# Altium footprint library YQPOWER.PcbLib: 215 footprints (part 10 of 14)
Each footprint in its own frame and in the unit in brackets; x right, y up, seen from the top. Pads: shape width x height; smd on the part's side, far side on the other; paste and mask are expansions set on the pad; w line width, h text height; cw(c..) or ccw(c..) is an arc to the next point about the centre after c.
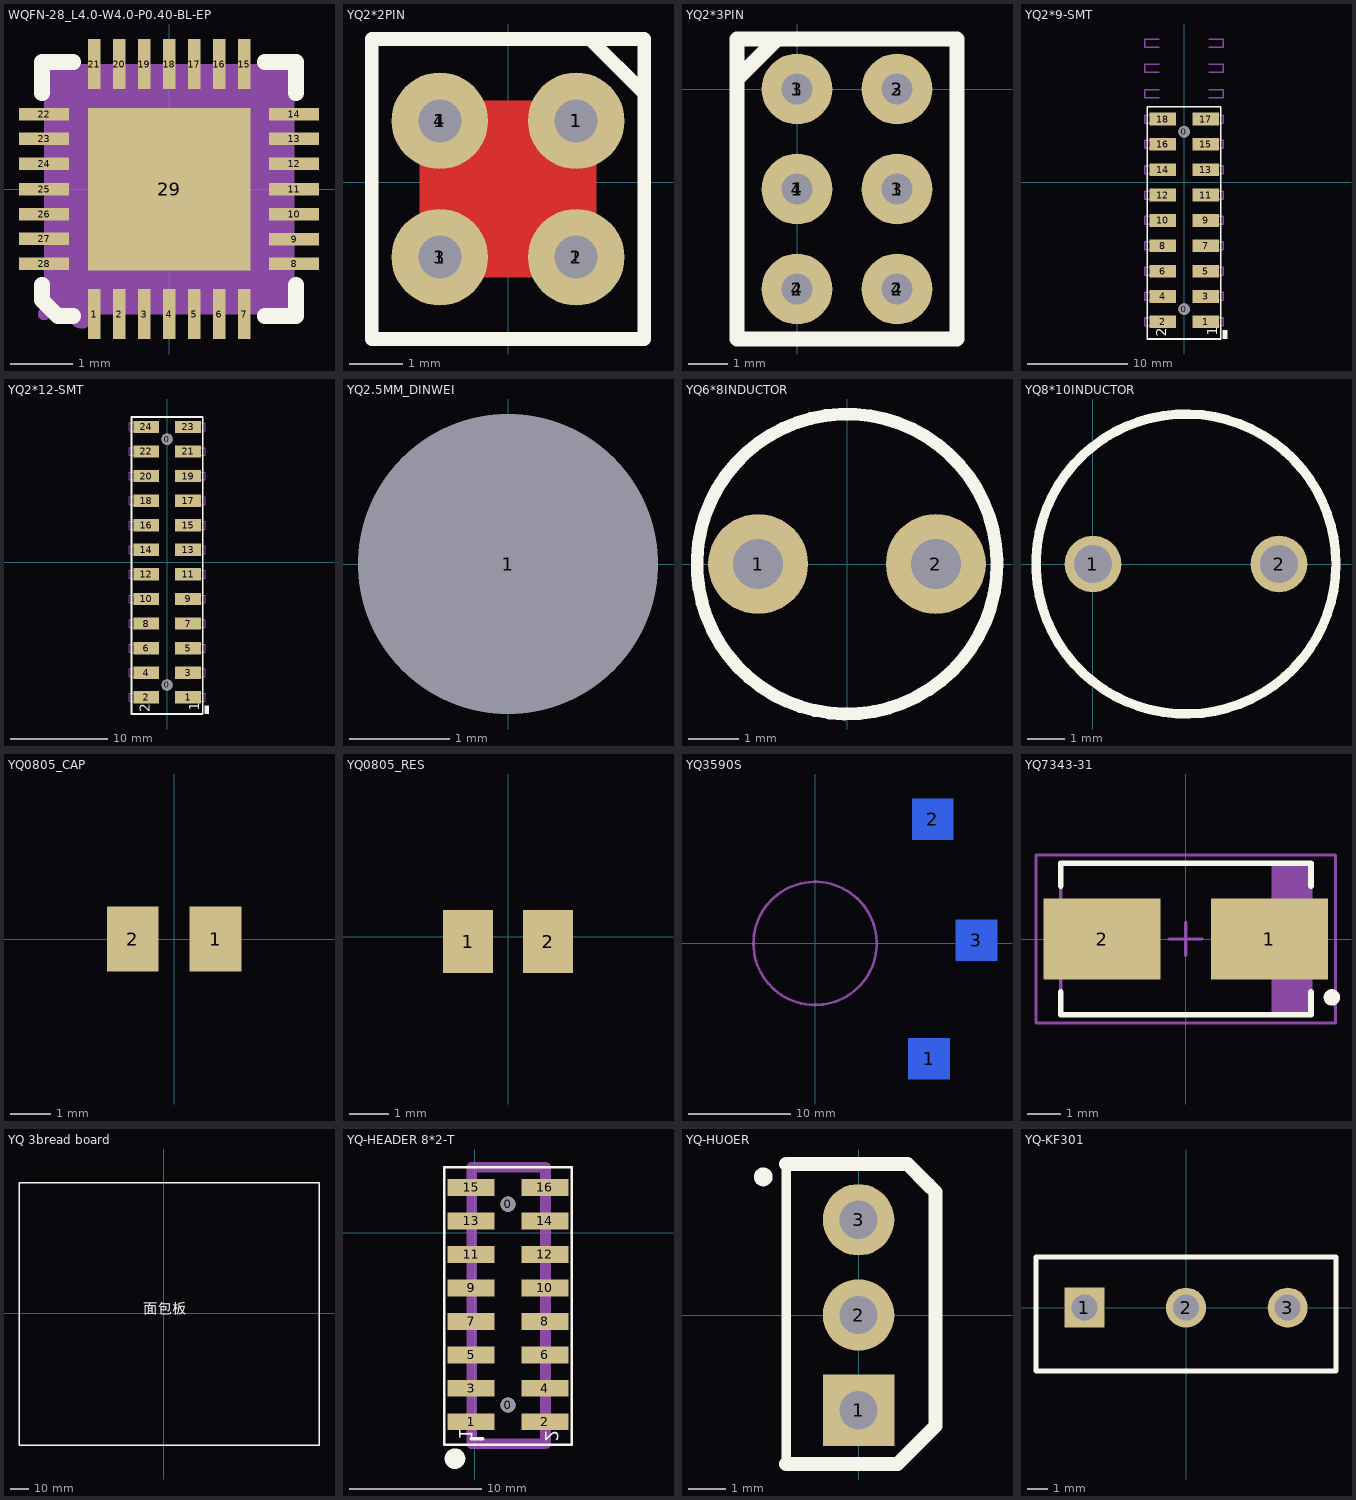
[diagram p9: the footprints below, top view; thin cyan lines are the x and y axes]

## WQFN-28_L4.0-W4.0-P0.40-BL-EP [mm]
pads (29):
  rect 0.2x0.8 smd: 1(-1.2,-2) 2(-0.8,-2) 3(-0.4,-2) 4(0,-2) 5(0.4,-2) 6(0.8,-2) 7(1.2,-2) 15(1.2,2) 16(0.8,2) 17(0.4,2) 18(0,2) 19(-0.4,2) 20(-0.8,2) 21(-1.2,2)
  rect 0.8x0.2 smd: 8(2,-1.2) 9(2,-0.8) 10(2,-0.4) 11(2,0) 12(2,0.4) 13(2,0.8) 14(2,1.2) 22(-2,1.2) 23(-2,0.8) 24(-2,0.4) 25(-2,0) 26(-2,-0.4) 27(-2,-0.8) 28(-2,-1.2)
  rect 2.6x2.6 smd: 29(0,0)
Top Overlay:
  lines w0.254: -2.032,-1.531 -2.032,-1.778 -1.778,-2.032 -1.531,-2.032 ; -2.032,1.531 -2.032,2.032 -1.531,2.032 -1.651,2.032 ; 1.531,-2.032 2.032,-2.032 2.032,-1.531 ; 1.531,2.032 2.032,2.032 2.032,1.531
Mechanical 4:
  region: -2,2 2,2 2,-2 -2,-2
Mechanical 5:
  region: -1.3,1.3 1.3,1.3 1.3,-1.3 -1.3,-1.3
  region: -1.3,2 -1.1,2 -1.1,1.6 -1.3,1.6
  region: -0.9,2 -0.7,2 -0.7,1.6 -0.9,1.6
  region: -0.5,2 -0.3,2 -0.3,1.6 -0.5,1.6
  region: -0.1,2 0.1,2 0.1,1.6 -0.1,1.6
  region: 0.3,2 0.5,2 0.5,1.6 0.3,1.6
  region: 0.7,2 0.9,2 0.9,1.6 0.7,1.6
  region: 1.1,2 1.3,2 1.3,1.6 1.1,1.6
  region: -2,-1.3 -2,-1.1 -1.6,-1.1 -1.6,-1.3
  region: -2,-0.9 -2,-0.7 -1.6,-0.7 -1.6,-0.9
  region: -2,-0.5 -2,-0.3 -1.6,-0.3 -1.6,-0.5
  region: -2,-0.1 -2,0.1 -1.6,0.1 -1.6,-0.1
  region: -2,0.3 -2,0.5 -1.6,0.5 -1.6,0.3
  region: -2,0.7 -2,0.9 -1.6,0.9 -1.6,0.7
  region: -2,1.1 -2,1.3 -1.6,1.3 -1.6,1.1
  region: 1.3,-2 1.1,-2 1.1,-1.6 1.3,-1.6
  region: 0.9,-2 0.7,-2 0.7,-1.6 0.9,-1.6
  region: 0.5,-2 0.3,-2 0.3,-1.6 0.5,-1.6
  region: 0.1,-2 -0.1,-2 -0.1,-1.6 0.1,-1.6
  region: -0.3,-2 -0.5,-2 -0.5,-1.6 -0.3,-1.6
  region: -0.7,-2 -0.9,-2 -0.9,-1.6 -0.7,-1.6
  region: -1.1,-2 -1.3,-2 -1.3,-1.6 -1.1,-1.6
  region: 2,1.3 2,1.1 1.6,1.1 1.6,1.3
  region: 2,0.9 2,0.7 1.6,0.7 1.6,0.9
  region: 2,0.5 2,0.3 1.6,0.3 1.6,0.5
  region: 2,0.1 2,-0.1 1.6,-0.1 1.6,0.1
  region: 2,-0.3 2,-0.5 1.6,-0.5 1.6,-0.3
  region: 2,-0.7 2,-0.9 1.6,-0.9 1.6,-0.7
  region: 2,-1.1 2,-1.3 1.6,-1.3 1.6,-1.1
Mechanical 6:
  circle w0.1: c-2,-2 r0.05
Mechanical 15:
  circle w0.2: c-1.397,-2.032 r0.1

## YQ2*2PIN [mm]
pads (8):
  round 1.8 hole 0.8: 1(-1.27,-1.397) 1(-1.27,1.143) 1(1.27,-1.397) 1(1.27,1.143)
  round 2 on Top Paste: 1(1.27,1.143) 2(1.27,-1.397) 3(-1.27,-1.397) 4(-1.27,1.143)
Top Layer:
  region: -1.27,1.143 -1.27,-1.397 1.27,-1.397 1.27,1.143
  lines w0.762: -1.27,-1.397 1.27,-1.397 1.27,1.143 -1.27,1.143 -1.27,-1.397
Bottom Layer:
  region: -1.27,1.143 -1.27,-1.397 1.27,-1.397 1.27,1.143
Top Overlay:
  lines w0.254: 1.524,2.667 2.54,1.651 ; -2.54,-2.921 2.54,-2.921 2.54,2.667 -2.54,2.667 -2.54,-2.921

## YQ2*3PIN [mm]
pads (12):
  round 1.8 hole 0.8: 1(0,-2.54) 1(2.54,-2.54) 2(0,-5.08) 2(2.54,-5.08) 3(0,0) 3(2.54,0)
  round 2 on Top Paste: 1(0,0) 2(2.54,0) 3(2.54,-2.54) 4(0,-5.08) 4(0,-2.54) 4(2.54,-5.08)
Top Overlay:
  lines w0.381: -1.524,0.254 -0.508,1.27 ; -1.524,-6.35 4.064,-6.35 4.064,1.27 -1.524,1.27 -1.524,-6.35

## YQ2*9-SMT [mil] "with location hole"
pads (20):
  round 45.28 hole 45.28: 0(0,-500) 0(0,200)
  rect 105x50 smd: 1(85,-550) 2(-85,-550) 3(85,-450) 4(-85,-450) 5(85,-350) 6(-85,-350) 7(85,-250) 8(-85,-250) 9(85,-150) 10(-85,-150) 11(85,-50) 12(-85,-50) 13(85,50) 14(-85,50) 15(85,150) 16(-85,150) 17(85,250) 18(-85,250)
Top Overlay:
  region: 170,-616.5 152,-616.5 152,-583.5 170,-583.5
  lines w7: -145,298.43 -145,-618 145,-618 145,298.82 -145,298.82
  text "1" at 130,-605 h40
  text "2" at -70,-610 h40
Mechanical 5:
  lines w5: -97.5,-566 -155,-566 -155,-534 -97.5,-534 ; -97.5,-466 -155,-466 -155,-434 -97.5,-434 ; -97.5,-366 -155,-366 -155,-334 -97.5,-334 ; -97.5,-266 -155,-266 -155,-234 -97.5,-234 ; -97.5,-166 -155,-166 -155,-134 -97.5,-134 ; -97.5,-66 -155,-66 -155,-34 -97.5,-34 ; -97.5,34 -155,34 -155,66 -97.5,66 ; -97.5,134 -155,134 -155,166 -97.5,166 ; -97.5,234 -155,234 -155,266 -97.5,266 ; -97.5,334 -155,334 -155,366 -97.5,366 ; -97.5,434 -155,434 -155,466 -97.5,466 ; -97.5,534 -155,534 -155,566 -97.5,566 ; 97.5,-566 155,-566 155,-534 97.5,-534 ; 97.5,-466 155,-466 155,-434 97.5,-434 ; 97.5,-366 155,-366 155,-334 97.5,-334 ; 97.5,-266 155,-266 155,-234 97.5,-234 ; 97.5,-166 155,-166 155,-134 97.5,-134 ; 97.5,-66 155,-66 155,-34 97.5,-34 ; 97.5,34 155,34 155,66 97.5,66 ; 97.5,134 155,134 155,166 97.5,166 ; 97.5,234 155,234 155,266 97.5,266 ; 97.5,334 155,334 155,366 97.5,366 ; 97.5,434 155,434 155,466 97.5,466 ; 97.5,534 155,534 155,566 97.5,566
  text "1" at -153,-592 h40
  text "2" at 122,-580 h40

## YQ2*12-SMT [mil] "with location hole"
pads (26):
  round 45.28 hole 45.28: 0(0,-500) 0(0,500)
  rect 105x50 smd: 1(85,-550) 2(-85,-550) 3(85,-450) 4(-85,-450) 5(85,-350) 6(-85,-350) 7(85,-250) 8(-85,-250) 9(85,-150) 10(-85,-150) 11(85,-50) 12(-85,-50) 13(85,50) 14(-85,50) 15(85,150) 16(-85,150) 17(85,250) 18(-85,250) 19(85,350) 20(-85,350) 21(85,450) 22(-85,450) 23(85,550) 24(-85,550)
Top Overlay:
  region: 170,-616.5 152,-616.5 152,-583.5 170,-583.5
  lines w7: -145,-618 -145,361 -145,590 145,590 145,361 145,-618 -145,-618
  text "2" at -70,-610 h40
  text "1" at 130,-605 h40
Mechanical 5:
  lines w5: -97.5,-566 -155,-566 -155,-534 -97.5,-534 ; -97.5,-466 -155,-466 -155,-434 -97.5,-434 ; -97.5,-366 -155,-366 -155,-334 -97.5,-334 ; -97.5,-266 -155,-266 -155,-234 -97.5,-234 ; -97.5,-166 -155,-166 -155,-134 -97.5,-134 ; -97.5,-66 -155,-66 -155,-34 -97.5,-34 ; -97.5,34 -155,34 -155,66 -97.5,66 ; -97.5,134 -155,134 -155,166 -97.5,166 ; -97.5,234 -155,234 -155,266 -97.5,266 ; -97.5,334 -155,334 -155,366 -97.5,366 ; -97.5,434 -155,434 -155,466 -97.5,466 ; -97.5,534 -155,534 -155,566 -97.5,566 ; 97.5,-566 155,-566 155,-534 97.5,-534 ; 97.5,-466 155,-466 155,-434 97.5,-434 ; 97.5,-366 155,-366 155,-334 97.5,-334 ; 97.5,-266 155,-266 155,-234 97.5,-234 ; 97.5,-166 155,-166 155,-134 97.5,-134 ; 97.5,-66 155,-66 155,-34 97.5,-34 ; 97.5,34 155,34 155,66 97.5,66 ; 97.5,134 155,134 155,166 97.5,166 ; 97.5,234 155,234 155,266 97.5,266 ; 97.5,334 155,334 155,366 97.5,366 ; 97.5,434 155,434 155,466 97.5,466 ; 97.5,534 155,534 155,566 97.5,566
  text "2" at 122,-580 h40
  text "1" at -153,-592 h40

## YQ2.5MM_DINWEI [mm] "5mm high,5mm D,1mm hole"
pads (1):
  round 2 hole 3: 1(0,0)

## YQ6*8INDUCTOR [mm]
pads (2):
  round 2 hole 1: 1(-1.778,0) 2(1.778,0)
Top Overlay:
  lines w0.254: 2.999,0.079 ccw(c0,0) 3,0

## YQ8*10INDUCTOR [mil]
pads (2):
  round 60 hole 40: 1(0,0) 2(196.85,0)
Top Overlay:
  circle w10: c98.43,0 r158.71

## YQ0805_CAP [mil]
pads (2):
  rect 50x63 smd: 1(40,0) 2(-40,0)
Bottom Overlay:
  lines w15: -150,0 -25,0 ; -25,-60 -25,60 ; 25,-60 25,60 ; 25,0 140,0

## YQ0805_RES [mil]
pads (2):
  rect 50x63 smd: 1(-40,-5) 2(40,-5)
Bottom Overlay:
  lines w15: -150,0 -100,0 ; 95,0 150,0 ; -95,-40 95,-40 95,35 -95,35 -95,-40

## YQ3590S [mm] "可调电位器"
pads (3):
  rect 4x4 smd far side: 1(11.1,-11.227) 2(11.481,12.09) 3(15.723,0.305)
Bottom Overlay:
  lines w0.254: 5.917,9.861 ccw(c0,0) 5.979,9.823
  text "1 中间位置" at 18.669,-15.621 h2.79
  text "2 远离PCB" at 24.46,-4.267 h2.79
  text "3 靠经PCB" at 16.688,14.681 h2.79
Mechanical 1:
  lines w0.254: 3.087,5.145 ccw(c0,0) 3.12,5.125

## YQ7343-31 [mm] "Medium Density based on Kemet T495 dimensions"
height 3.1
pads (2):
  rect 3.55x2.45 smd: 1(2.54,0) 2(-2.54,0)
Top Overlay:
  circle w0.25: c4.439,-1.775 r0.125
  lines w0.178: -3.8,-1.614 -3.8,-2.3 3.8,-2.3 3.8,-1.614 ; -3.8,1.614 -3.8,2.3 3.8,2.3 3.8,1.614
Mechanical 5:
  region: 3.8,2.3 2.65,2.3 2.65,-2.3 3.8,-2.3
  lines w0.1: 2.65,-2.3 2.65,2.3 ; -3.8,-2.3 3.8,-2.3 3.8,2.3 -3.8,2.3 -3.8,-2.3
  text ".Designator" at 1.775,0.5 h1.02
Mechanical 15:
  lines w0.1: -0.5,0 0.5,0 ; 0,-0.5 0,0.5 ; -4.55,-2.55 -4.55,2.55 4.55,2.55 4.55,-2.55 -4.55,-2.55
3D body: height 3.1, standoff 0, extent -3.8,-2.3 3.8,2.3
3D body: height 3.1, standoff 3.1, extent 2.651,-2.299 3.799,2.299

## YQ 3bread board [mm]
Top Overlay:
  lines w0.762: -80.513,-73.483 86.487,-73.483 86.487,72.517 -80.513,72.517 -80.513,-73.483
  text "面包板" at -11.43,-2.286 h10

## YQ-HEADER 8*2-T [mil]
pads (18):
  round 45.28 hole 45.28: 0(100,-515) 0(100,85)
  rect 140x50 smd: 1(-10,-565) 2(210,-565) 3(-10,-465) 4(210,-465) 5(-10,-365) 6(210,-365) 7(-10,-265) 8(210,-265) 9(-10,-165) 10(210,-165) 11(-10,-65) 12(210,-65) 13(-10,35) 14(210,35) 15(-10,135) 16(210,135)
Top Overlay:
  circle w30: c-58.38,-675 r15.81
  lines w7: -90,-633 -90,194.88 290,194.88 290,-633 -90,-633
  lines w10: -10,-615 25,-615
  text "1" at -45.3,-620.47 h40
  text "2" at 210.93,-624.1 h40
Mechanical 1:
  lines w31.5: -7.95,-630 92.95,-630 212.05,-630 212.05,194.88 -7.95,194.88 -7.95,-630
Mechanical 5:
  lines w5: 2.5,-581 -55,-581 -55,-549 2.5,-549 ; 2.5,-481 -55,-481 -55,-449 2.5,-449 ; 2.5,-381 -55,-381 -55,-349 2.5,-349 ; 2.5,-281 -55,-281 -55,-249 2.5,-249 ; 2.5,-181 -55,-181 -55,-149 2.5,-149 ; 2.5,-81 -55,-81 -55,-49 2.5,-49 ; 2.5,19 -55,19 -55,51 2.5,51 ; 2.5,119 -55,119 -55,151 2.5,151 ; 197.5,-581 255,-581 255,-549 197.5,-549 ; 197.5,-481 255,-481 255,-449 197.5,-449 ; 197.5,-381 255,-381 255,-349 197.5,-349 ; 197.5,-281 255,-281 255,-249 197.5,-249 ; 197.5,-181 255,-181 255,-149 197.5,-149 ; 197.5,-81 255,-81 255,-49 197.5,-49 ; 197.5,19 255,19 255,51 197.5,51 ; 197.5,119 255,119 255,151 197.5,151
  text "1" at 253,-607 h40
  text "2" at -22,-595 h40

## YQ-HUOER [mil]
height 200
pads (3):
  rect 75x75 hole 40: 1(0,-100)
  round 75 hole 40: 2(0,0) 3(0,100)
Top Overlay:
  circle w9.84: c-100.08,145 r4.92
  lines w10: -76.03,-156.43 -76.03,158.53
  lines w15: -76.03,-156.43 40.82,-156.43 80.71,-116.54 80.71,129.13 73.23,136.61 51.31,158.53 -76.03,158.53

## YQ-KF301 [mm]
pads (3):
  rect 2x2 hole 1.3: 1(-5.08,0)
  round 2 hole 1.3: 2(0,0) 3(5.08,0)
Top Overlay:
  lines w0.254: -7.493,-3.175 -7.493,2.54 7.493,2.54 7.493,-3.175 -7.493,-3.175